# Altium footprint library Разъемы.PcbLib: 291 footprints (part 8 of 19)
Each footprint in its own frame and in the unit in brackets; x right, y up, seen from the top. Pads: shape width x height; smd on the part's side, far side on the other; paste and mask are expansions set on the pad; w line width, h text height; cw(c..) or ccw(c..) is an arc to the next point about the centre after c.
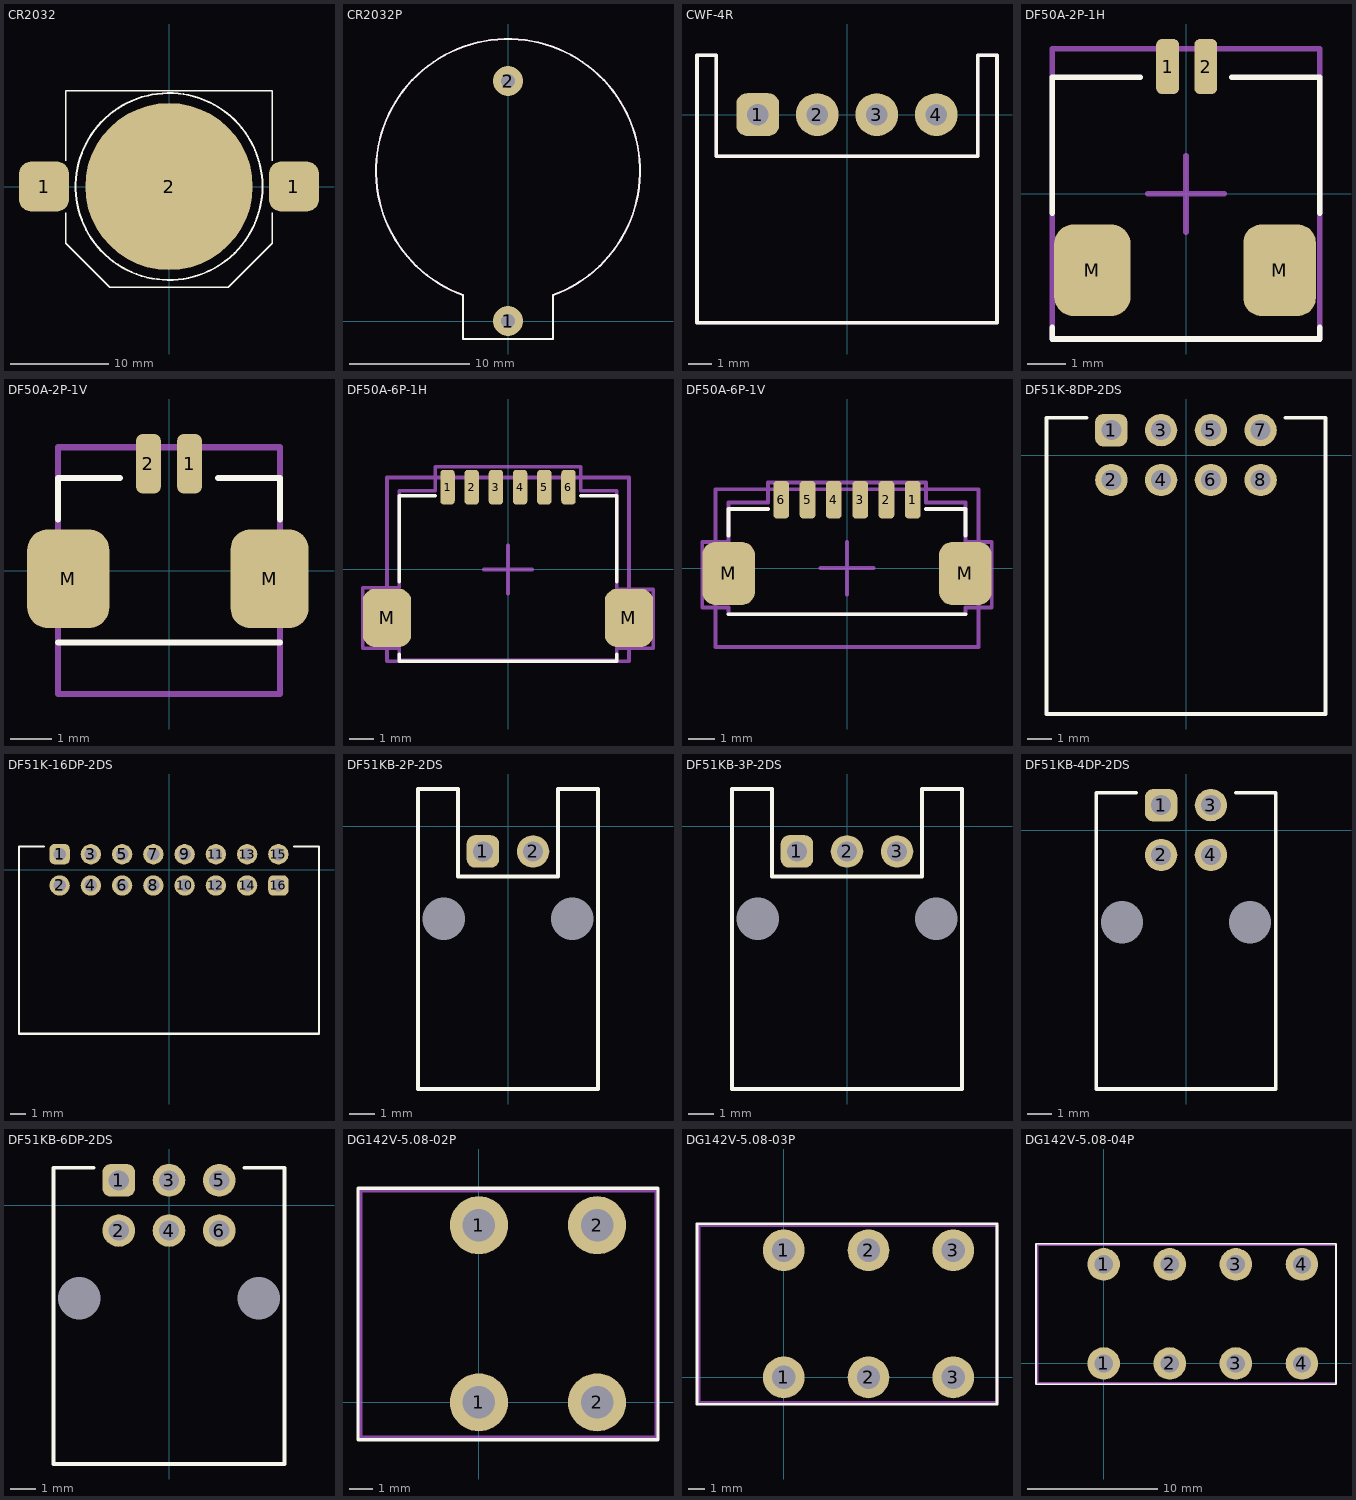
[diagram p7: the footprints below, top view; thin cyan lines are the x and y axes]

## CR2032 [mm]
pads (3):
  rrect50% 5.1x5.1 smd: 1(-12.7,0) 1(12.7,0)
  round 17 smd paste-16: 2(0,0)
Top Overlay:
  circle w0.2: c0,0 r9.5
  lines w0.15: -10.5,-2.643 -10.5,-5.75 -6,-10.25 0,-10.25 6,-10.25 10.5,-5.75 10.5,-2.643 ; -10.5,2.643 -10.5,9.75 0,9.75 10.5,9.75 10.5,2.643
Top Designator:
  text ".Designator" at -3.999,-0.413 h0.8
Mechanical 29:
  text ".Designator" at -3.5,-0.3 h1
3D body "Battery CR2032.stp": height 3.17, standoff -0.01, extent -10.108,-10.008 9.908,10.008
3D body "battery_holder.stp": height 3.96, standoff 0, extent -15.334,-10.3 15.4,9.753

## CR2032P [mm] "Top and Side Loading Coin Cell Holders"
pads (2):
  round 2.5 hole 1.2: 1(0,0) 2(0,20)
Top Overlay:
  lines w0.15: -3.759,2.162 cw(c0,12.5) 3.759,2.162 ; -3.75,2.162 -3.75,-1.5 3.75,-1.5 3.75,2.162
Mechanical 29:
  lines w0.15: -3.759,1.162 -3.75,1.162 ; -3.759,2.162 cw(c0,12.5) 3.759,2.162 ; -3.759,2.165 -3.759,-1.5 3.741,-1.5 3.741,2.165 ; 3.75,1.162 3.759,1.162
3D body "User Library-CR2032_HOR_HOLD.step": height 8.5, standoff -4, extent -11,-1 11,23.5

## CWF-4R [mm]
pads (4):
  rrect50% 1.8x1.8 hole 0.9: 1(-3.75,0)
  round 1.8 hole 0.9: 2(-1.25,0) 3(1.25,0) 4(3.75,0)
Top Overlay:
  lines w0.15: -6.3,-8.75 -6.3,-1.75 -6.3,2.5 -5.5,2.5 -5.5,-1.75 0,-1.75 5.5,-1.75 5.5,2.5 6.3,2.5 6.3,-1.75 6.3,-8.75 -6.3,-8.75
  text "." at -4.25,1.75 h0.1
Top Courtyard:
  lines w0.15: -6.3,-8.75 -6.3,-1.75 -6.3,2.5 -5.5,2.5 -5.5,-1.75 0,-1.75 5.5,-1.75 5.5,2.5 6.3,2.5 6.3,-1.75 6.3,-8.75 -6.3,-8.75
3D body "User Library-DS1069-4 CWF-4R.step": height 5.75, standoff -3.5, extent -6.25,-8.9 6.25,2.6

## DF50A-2P-1H [mm]
height 7.05
pads (4):
  rrect50% 0.6x1.44 smd: 1(-0.482,3.334) 2(0.518,3.334)
  rrect50% 2x2.4 smd: M(-2.45,-2)
  rrect50% 1.9x2.4 smd: M(2.45,-2)
Top Overlay:
  lines w0.15: -3.5,-3.5 -3.5,-3.8 3.5,-3.8 3.5,-3.5 ; -3.5,-0.5 -3.5,3.05 -1.2,3.05 ; 1.2,3.05 3.5,3.05 3.5,-0.5
  text "." at -1.5,3.5 h0.1
Mechanical 15:
  lines w0.15: -1,0 0,0 ; 0,-1 0,0 ; 0,1 0,0 ; 1,0 0,0 ; -3.5,-3.8 -3.5,3.8 3.5,3.8 3.5,-3.8 -3.5,-3.8
3D body "DF50A-2P-1H.stp": height 6.11, standoff 0.04, extent -3.355,-3.85 3.455,3.75

## DF50A-2P-1V [mm]
height 7.05
pads (4):
  rrect50% 0.6x1.44 smd: 1(0.5,2.6) 2(-0.5,2.6)
  rrect50% 2x2.4 smd: M(-2.45,-0.2)
  rrect50% 1.9x2.4 smd: M(2.45,-0.2)
Top Overlay:
  lines w0.15: -2.7,-1.75 0,-1.75 2.7,-1.75 ; -2.7,1.25 -2.7,2.25 -1.2,2.25 ; 1.2,2.25 2.7,2.25 2.7,1.25
  text "." at 1.5,2.925 h0.1
Mechanical 15:
  lines w0.15: -2.7,-3 -2.7,3 2.7,3 2.7,-3 -2.7,-3
3D body "DF50A-2P-1V(51).stp": height 7.06, standoff 0.01, extent -2.65,-2.76 2.6,2.91

## DF50A-6P-1H [mm]
height 7.05
pads (8):
  rrect50% 0.6x1.44 smd: 1(-2.5,3.4) 2(-1.5,3.4) 3(-0.5,3.4) 4(0.5,3.4) 5(1.5,3.4) 6(2.5,3.4)
  rrect50% 2x2.4 smd: M(-5,-2) M(5,-2)
Top Overlay:
  lines w0.15: -4.5,-3.5 -4.5,-3.8 4.5,-3.8 4.5,-3.5 ; -4.5,-0.5 -4.5,3.05 -3,3.05 ; 3,3.05 4.5,3.05 4.5,-0.5
  text "." at -3.5,3.5 h0.1
Top Courtyard:
  lines w0.15: -6,-3.25 -6,-0.75 -4.5,-0.75 -4.5,3.25 -3,3.25 -3,4.25 1,4.25 3,4.25 3,3.25 4.5,3.25 4.5,-0.828 6,-0.828 6,-3.25 4.5,-3.25 4.5,-3.75 2,-3.75 -4.5,-3.75 -4.5,-3.25 -6,-3.25
Top Designator:
  text ".Designator" at -3.999,-0.042 h0.8
Mechanical 15:
  lines w0.15: -1,0 0,0 ; 0,-1 0,0 ; 0,1 0,0 ; 1,0 0,0 ; -5,-3.8 5,-3.8 5,3.8 -5,3.8 -5,-3.8
3D body "DF50A-6P-1H.stp": height 6.07, standoff -0.01, extent -5.405,-3.8 5.405,3.8

## DF50A-6P-1V [mm]
height 7.05
pads (9):
  rrect50% 0.6x1.44 smd: 1(2.5,2.6) 1(2.5,2.6) 2(1.5,2.6) 3(0.5,2.6) 4(-0.5,2.6) 5(-1.5,2.6) 6(-2.5,2.6)
  rrect50% 2x2.4 smd: M(-4.5,-0.2) M(4.5,-0.2)
Top Overlay:
  lines w0.15: -4.5,-1.75 0,-1.75 4.5,-1.75 ; -4.5,1.25 -4.5,2.25 -3,2.25 ; 3,2.25 4.5,2.25 4.5,1.25
  text "." at 3.475,2.9 h0.1
Top Courtyard:
  lines w0.15: -5.5,-1.5 -4.5,-1.5 -4.5,-1.75 0,-1.75 4.5,-1.75 4.5,-1.5 5.5,-1.5 5.5,1 4.5,1 4.5,2.5 3,2.5 3,3.25 0,3.25 -3,3.25 -3,2.5 -4.5,2.5 -4.5,1 -5.5,1 -5.5,-1.5
Top Designator:
  text ".Designator" at -3.999,-0.093 h0.8
Mechanical 15:
  lines w0.15: -1,0 0,0 ; 0,-1 0,0 ; 0,1 0,0 ; 1,0 0,0 ; -5,-3 -5,3 5,3 5,-3 -5,-3
3D body "DF50A-6P-1V(51).stp": height 7.06, standoff 0.01, extent -4.625,-2.8 4.625,2.87

## DF51K-8DP-2DS [mm]
pads (8):
  rrect50% 1.3x1.3 hole 0.8: 1(-3,1)
  round 1.3 hole 0.8: 2(-3,-1) 3(-1,1) 4(-1,-1) 5(1,1) 6(1,-1) 7(3,1) 8(3,-1)
Top Overlay:
  lines w0.15: -4,1.5 -5.6,1.5 -5.6,-10.4 5.6,-10.4 5.6,1.5 4,1.5
Top Designator:
  text ".Designator" at -3.999,-4.628 h0.8
3D body "DF51K-8DP-2DS_4800594000_3D_stp.stp": height 8.78, standoff -2.97, extent -5.6,-10.377 5.6,1.523

## DF51K-16DP-2DS [mm]
pads (16):
  rrect50% 1.3x1.3 hole 0.8: 1(-7,1) 16(7,-1)
  round 1.3 hole 0.8: 2(-7,-1) 3(-5,1) 4(-5,-1) 5(-3,1) 6(-3,-1) 7(-1,1) 8(-1,-1) 9(1,1) 10(1,-1) 11(3,1) 12(3,-1) 13(5,1) 14(5,-1) 15(7,1)
Top Overlay:
  lines w0.15: -8,1.5 -9.6,1.5 -9.6,-10.5 1.6,-10.5 ; -1.6,-10.5 9.6,-10.5 9.6,1.5 8,1.5
Top Designator:
  text ".Designator" at -3.999,-4.678 h0.8
3D body "DF51K-16DP-2DS_4800598000_3D_stp.stp": height 9.03, standoff -2.72, extent -9.601,-10.535 9.599,1.365

## DF51KB-2P-2DS [mm]
pads (4):
  rrect50% 1.3x1.3 hole 0.8: 1(-1,-1)
  round 1.3 hole 0.8: 2(1,-1)
  round 0 hole 1.7 unplated: 5(-2.57,-3.7) 6(2.57,-3.7)
Top Overlay:
  lines w0.15: -3.6,-10.5 3.6,-10.5 3.6,1.5 2,1.5 2,-2 -2,-2 -2,1.5 -3.6,1.5 -3.6,-10.5
Top Designator:
  text ".Designator" at -3.999,-4.767 h0.8
3D body "DF51KB-2P-2DS_4800587000_3D_stp.stp": height 6.47, standoff -2.83, extent -3.599,-10.533 3.601,1.517

## DF51KB-3P-2DS [mm]
pads (5):
  rrect50% 1.3x1.3 hole 0.8: 1(-2,-1)
  round 1.3 hole 0.8: 2(0,-1) 3(2,-1)
  round 0 hole 1.7 unplated: 5(-3.57,-3.7) 6(3.57,-3.7)
Top Overlay:
  lines w0.15: -4.6,-10.5 4.6,-10.5 4.6,1.5 3,1.5 3,-2 -3,-2 -3,1.5 -4.6,1.5 -4.6,-10.5
Top Designator:
  text ".Designator" at -3.999,-4.759 h0.8
3D body "DF51KB-3P-2DS_4800588000_3D_stp.stp": height 6.41, standoff -2.89, extent -4.609,-10.46 4.591,1.59

## DF51KB-4DP-2DS [mm]
pads (6):
  rrect50% 1.3x1.3 hole 0.8: 1(-1,1)
  round 1.3 hole 0.8: 2(-1,-1) 3(1,1) 4(1,-1)
  round 0 hole 1.7 unplated: 5(-2.57,-3.7) 6(2.57,-3.7)
Top Overlay:
  lines w0.15: -2,1.5 -3.6,1.5 -3.6,-10.4 3.6,-10.4 3.6,1.5 2,1.5
Top Designator:
  text ".Designator" at -3.999,-4.628 h0.8
3D body "DF51KB-4DP-2DS_4800592000_3D_stp.stp": height 8.78, standoff -2.97, extent -3.6,-10.384 3.6,1.516

## DF51KB-6DP-2DS [mm]
pads (8):
  rrect50% 1.3x1.3 hole 0.8: 1(-2,1)
  round 1.3 hole 0.8: 2(-2,-1) 3(0,1) 4(0,-1) 5(2,1) 6(2,-1)
  round 0 hole 1.7 unplated: 5(-3.57,-3.7) 6(3.57,-3.7)
Top Overlay:
  lines w0.15: -3,1.5 -4.6,1.5 -4.6,-10.3 4.6,-10.3 4.6,1.5 3,1.5
Top Designator:
  text ".Designator" at -3.999,-4.591 h0.8
3D body "DF51KB-6DP-2DS_4800593000_3D_stp.stp": height 8.72, standoff -3.03, extent -4.6,-10.4 4.6,1.5

## DG142V-5.08-02P [mm]
height 15
pads (4):
  round 2.5 hole 1.4: 1(0,0) 1(0,7.62) 2(5.08,0) 2(5.08,7.62)
Top Overlay:
  lines w0.15: -5.2,-1.6 -5.2,9.2 7.7,9.2 7.7,-1.6 -5.2,-1.6
Top Courtyard:
  lines w0.15: -5.08,-1.5 7.62,-1.5 7.62,9.1 -5.08,9.1 -5.08,-1.5
Top Designator:
  text ".Designator" at -2.749,2.321 h0.8
3D body "DG142V-5.08-02P-14-00AH.STEP": height 14.1, standoff -3.5, extent -5.1,-4.1 7.6,9.1

## DG142V-5.08-03P [mm]
height 15
pads (6):
  round 2.5 hole 1.4: 1(0,0) 1(0,7.62) 2(5.08,0) 2(5.08,7.62) 3(10.16,0) 3(10.16,7.62)
Top Overlay:
  lines w0.15: -5.2,-1.6 12.78,-1.6 12.78,9.2 -5.2,9.2 -5.2,-1.6
Top Courtyard:
  lines w0.15: -5.08,-1.5 -5.08,9.1 12.78,9.1 12.78,-1.5 -5.08,-1.5
Top Designator:
  text ".Designator" at -0.209,2.321 h0.8
3D body "DG142V-5.08-03P-14-00AH.STEP": height 14.1, standoff -3.5, extent -5.1,-4.1 12.68,9.1

## DG142V-5.08-04P [mm]
height 15
pads (8):
  round 2.5 hole 1.4: 1(0,0) 1(0,7.62) 2(5.08,0) 2(5.08,7.62) 3(10.16,0) 3(10.16,7.62) 4(15.24,0) 4(15.24,7.62)
Top Overlay:
  lines w0.15: -5.2,-1.6 -5.2,9.2 17.86,9.2 17.86,-1.6 -5.2,-1.6
Top Courtyard:
  lines w0.15: -5.08,-1.5 17.86,-1.5 17.86,9.1 -5.08,9.1 -5.08,-1.5
Top Designator:
  text ".Designator" at 2.331,2.321 h0.8
3D body "DG142V-5.08-04P-14-00AH.STEP": height 14.1, standoff -3.5, extent -5.1,-4.1 17.76,9.1